# Altium footprint library pi4.PcbLib: 46 footprints (part 3 of 3)
Each footprint in its own frame and in the unit in brackets; x right, y up, seen from the top. Pads: shape width x height; smd on the part's side, far side on the other; paste and mask are expansions set on the pad; w line width, h text height; cw(c..) or ccw(c..) is an arc to the next point about the centre after c.
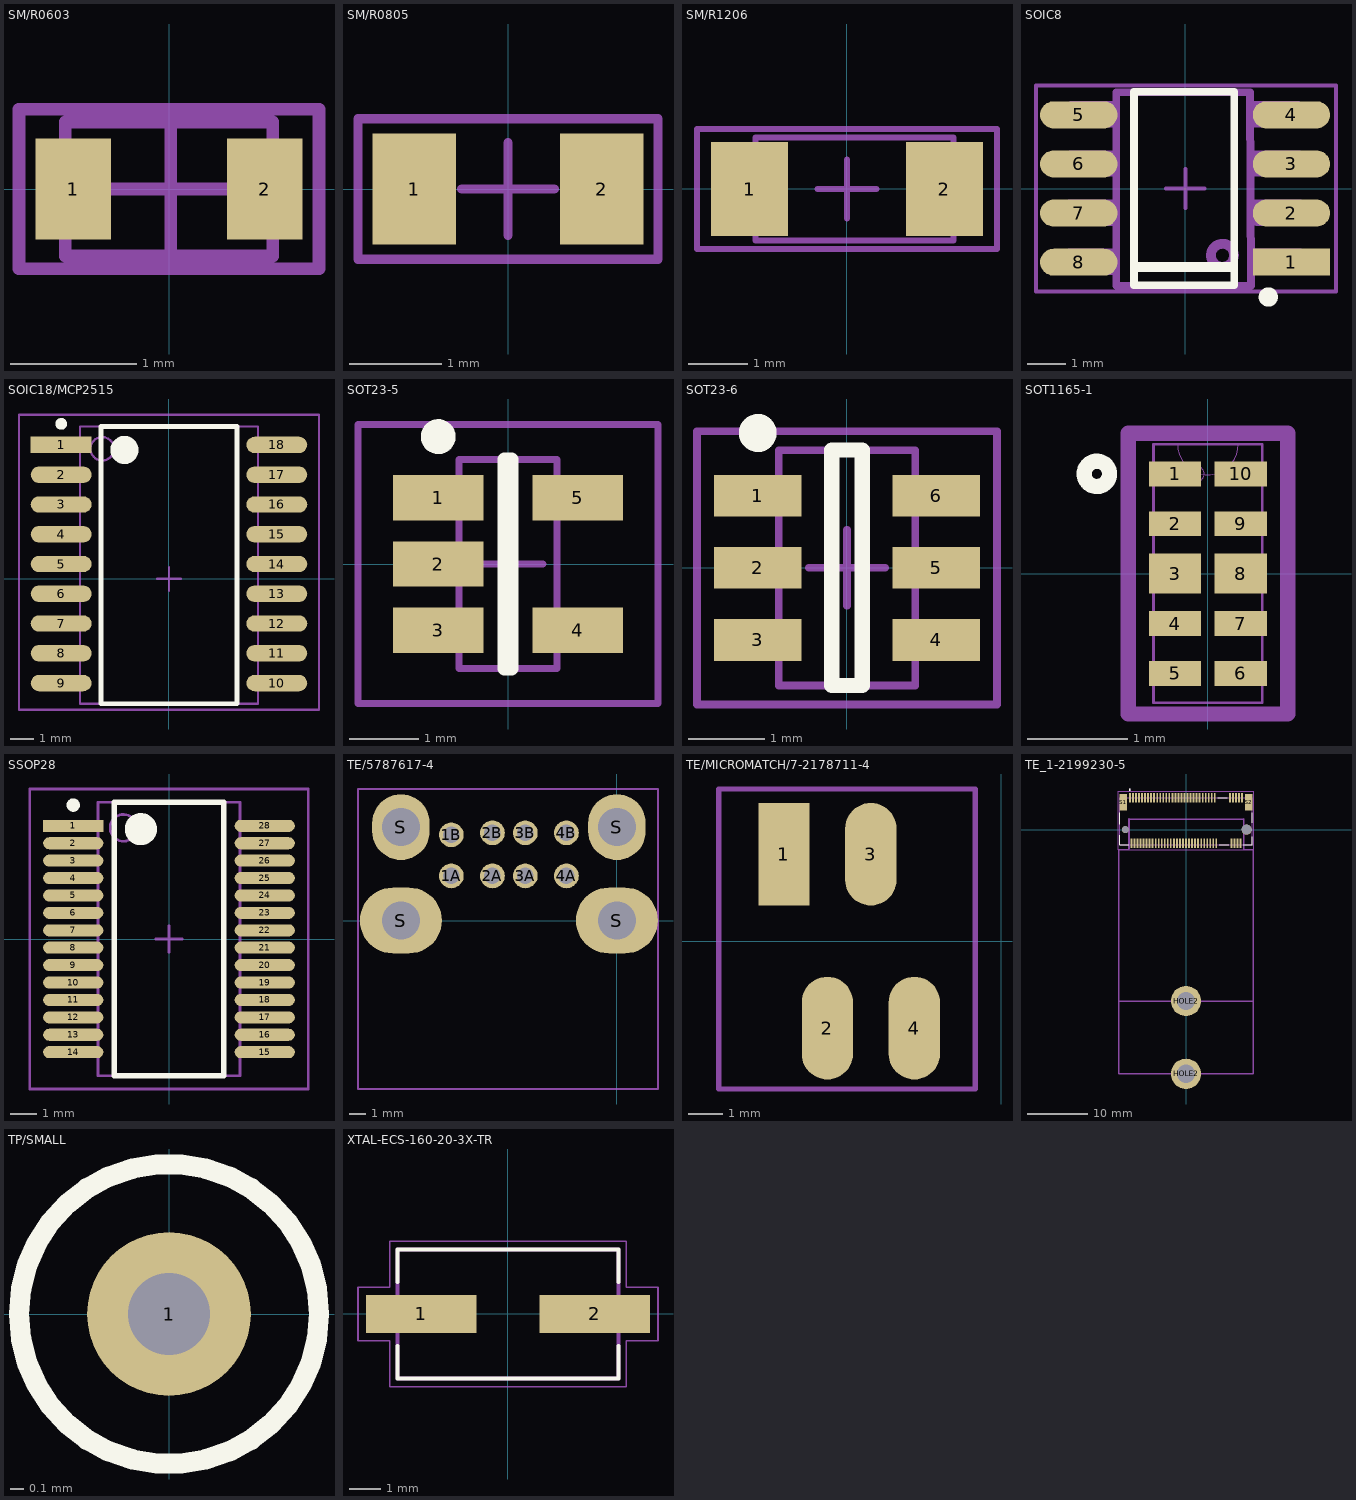
[diagram p2: the footprints below, top view; thin cyan lines are the x and y axes]

## SM/R0603 [mm] "Chip Resistor, Body 1.6x0.8mm, IPC Low Density"
height 0.6
pads (2):
  rect 0.6x0.8 smd: 1(-0.762,0) 2(0.762,0)
Mechanical 13:
  lines w0.1: -0.826,-0.533 -0.826,0.533 0.826,0.533 0.826,-0.533 -0.826,-0.533
Mechanical 15:
  lines w0.1: -0.462,0 0.488,0 ; 0.013,-0.475 0.013,0.475 ; -1.194,-0.635 -1.194,0.635 1.194,0.635 1.194,-0.635 -1.194,-0.635
3D body "RES0603-1.STEP": height 0.4, standoff 0, extent -0.8,-0.4 0.8,0.4

## SM/R0805 [mm] "Chip Resistor, Body 2.0x1.3mm, IPC Low Density"
height 0.65
pads (2):
  rect 0.9x1.2 smd: 1(-1.016,0) 2(1.016,0)
Mechanical 15:
  lines w0.1: -0.5,0 0.5,0 ; 0,-0.5 0,0.5 ; -1.626,-0.762 1.626,-0.762 1.626,0.762 -1.626,0.762 -1.626,-0.762
3D body "RES_0805L.STEP": height 0.21, standoff -0.2, extent -1,-0.625 1,0.625

## SM/R1206 [mm] "Chip Resistor, Body 3.2x1.6mm, IPC Low Density"
height 0.71
pads (2):
  rect 1.3x1.6 smd: 1(-1.651,0) 2(1.651,0)
Mechanical 13:
  lines w0.1: -1.548,-0.875 -1.548,0.875 1.802,0.875 1.802,-0.875 -1.548,-0.875
Mechanical 15:
  lines w0.1: -0.5,0 0.5,0 ; 0,-0.5 0,0.5 ; -2.54,-1.016 -2.54,1.016 2.54,1.016 2.54,-1.016 -2.54,-1.016
3D body "R1206.STEP": height 0.55, standoff 0, extent -1.6,-0.8 1.6,0.8

## SOIC8 [mm] "8-Pin Small Outline Integrated Circuit 1.27 mm Pitch, IPC Low Density"
height 1.75
pads (8):
  rect 2x0.7 smd: 1(2.749,-1.905)
  oval 2x0.7 smd: 2(2.749,-0.635) 3(2.749,0.635) 4(2.749,1.905) 5(-2.749,1.905) 6(-2.749,0.635) 7(-2.749,-0.635) 8(-2.749,-1.905)
Top Overlay:
  circle w0.25: c2.151,-2.805 r0.125
  lines w0.2: -1.321,-2.5 -1.321,2.5 1.27,2.5 1.27,-2.5 -1.321,-2.5
  lines w0.254: -1.27,-2.032 1.219,-2.032
Mechanical 13:
  circle w0.254: c0.965,-1.727 r0.297
  lines w0.2: -2.565,-2.083 -2.565,-1.651 ; -2.565,-0.813 -2.565,-0.381 ; -2.54,0.457 -2.54,0.889 ; -2.515,1.727 -2.515,2.159 ; -1.88,-2.134 -2.997,-2.134 -2.997,-1.651 -1.829,-1.651 ; -1.88,-0.864 -2.997,-0.864 -2.997,-0.381 -1.829,-0.381 ; -1.854,0.406 -2.972,0.406 -2.972,0.889 -1.803,0.889 ; -1.829,1.676 -2.946,1.676 -2.946,2.159 -1.778,2.159 ; -1.778,2.489 -1.778,-2.515 1.702,-2.515 1.676,2.489 -1.753,2.489 ; 1.753,2.159 2.921,2.159 2.921,1.676 1.803,1.676 ; 1.778,0.889 2.946,0.889 2.946,0.406 1.829,0.406 ; 1.803,-1.651 2.972,-1.651 2.972,-2.134 1.854,-2.134 ; 1.803,-0.381 2.972,-0.381 2.972,-0.864 1.854,-0.864 ; 2.489,1.727 2.489,2.159 ; 2.515,0.457 2.515,0.889 ; 2.54,-2.083 2.54,-1.651 ; 2.54,-0.813 2.54,-0.381
Mechanical 15:
  lines w0.1: -0.494,0 0.506,0 ; 0.006,-0.5 0.006,0.5 ; -3.855,-2.667 -3.855,2.667 3.901,2.667 3.901,-2.667 -3.855,-2.667
3D body "SOIC-8.STEP": height 1.75, standoff 0, extent -2.966,-2.5 3.046,2.5

## SOIC18/MCP2515 [mm] "SOIC, 18-Leads, Body 9.4 Pitch 1.27mm, IPC Low Density"
height 2.65
pads (18):
  rect 2.6x0.7 smd: 1(-4.6,5.715)
  oval 2.6x0.7 smd: 2(-4.6,4.445) 3(-4.6,3.175) 4(-4.6,1.905) 5(-4.6,0.635) 6(-4.6,-0.635) 7(-4.6,-1.905) 8(-4.6,-3.175) 9(-4.6,-4.445) 10(4.6,-4.445) 11(4.6,-3.175) 12(4.6,-1.905) 13(4.6,-0.635) 14(4.6,0.635) 15(4.6,1.905) 16(4.6,3.175) 17(4.6,4.445) 18(4.6,5.715)
Top Overlay:
  circle w0.6: c-1.9,5.5 r0.3
  circle w0.25: c-4.6,6.615 r0.125
  lines w0.2: -2.9,-5.334 2.9,-5.334 2.9,6.5 -2.9,6.5 -2.9,-5.334
Mechanical 13:
  circle w0.1: c-2.85,5.55 r0.5
  lines w0.1: -3.8,-5.334 3.8,-5.334 3.8,6.5 -3.8,6.5 -3.8,-5.334
Mechanical 15:
  lines w0.1: -0.5,0 0.5,0 ; 0,-0.5 0,0.5 ; -6.4,-5.588 6.4,-5.588 6.4,7 -6.4,7 -6.4,-5.588
3D body "User Library-MCP2515 SOIC-18.STEP": height 2.48, standoff -0.01, extent -5.219,-5.115 5.321,6.385

## SOT23-5 [mm] "SOT23, 5-Leads, Body 3.0x2.6mm (max), Pitch 0.95mm, IPC Low Density"
height 1.1
pads (5):
  rect 1.3x0.65 smd: 1(-1,0.95) 2(-1,0) 3(-1,-0.95) 4(1,-0.95) 5(1,0.95)
Top Overlay:
  circle w0.25: c-1,1.825 r0.125
  lines w0.2: -0.05,-1.5 -0.05,1.5 0.05,1.5 0.05,-1.5 -0.05,-1.5
Mechanical 13:
  lines w0.1: -0.7,-1.5 0.7,-1.5 0.7,1.5 -0.7,1.5 -0.7,-1.5
Mechanical 15:
  lines w0.1: -0.5,0 0.5,0 ; 0,-0.5 0,0.5 ; -2.15,-2 -2.15,2 2.15,2 2.15,-2 -2.15,-2
3D body "SOT-23-5.STEP": height 1.45, standoff -0.01, extent -1.524,-1.5 1.476,1.5

## SOT23-6 [mm] "SOT23, 6-Leads, Body 3.1x3.2mm (max), Pitch 0.95mm, IPC Medium Density"
height 1.45
pads (6):
  rect 1.15x0.55 smd: 1(-1.175,0.95) 2(-1.175,0) 3(-1.175,-0.95) 4(1.175,-0.95) 5(1.175,0) 6(1.175,0.95)
Top Overlay:
  circle w0.25: c-1.175,1.775 r0.125
  lines w0.2: -0.2,-1.55 0.2,-1.55 0.2,1.55 -0.2,1.55 -0.2,-1.55
Mechanical 13:
  lines w0.1: -0.9,-1.55 -0.9,1.55 0.9,1.55 0.9,-1.55 -0.9,-1.55
Mechanical 15:
  lines w0.1: -0.5,0 0.5,0 ; 0,-0.5 0,0.5 ; -1.975,-1.8 -1.975,1.8 1.975,1.8 1.975,-1.8 -1.975,-1.8
3D body "SOT23-6.STEP": height 1.3, standoff 0, extent -1.499,-1.5 1.501,1.5

## SOT1165-1 [mm]
pads (10):
  rect 0.525x0.25 smd paste-0.152 mask+0: 1(-0.33,1) 2(-0.33,0.5) 4(-0.33,-0.5) 5(-0.33,-1) 6(0.33,-1) 7(0.33,-0.5) 9(0.33,0.5) 10(0.33,1)
  rect 0.525x0.4 smd paste+0 mask+0: 3(-0.33,0) 8(0.33,0)
Top Overlay:
  circle w0.152: c-1.114,1 r0.127
Mechanical 13:
  circle w0: c-0.114,1 r0.076
  lines w0: -0.305,1.295 ccw(c0,1.295) 0.305,1.295
  lines w0.025: -0.546,-1.295 0.546,-1.295 0.546,1.295 -0.546,1.295 -0.546,-1.295
Mechanical 15:
  lines w0.152: -0.8,-1.407 -0.8,1.407 0.8,1.407 0.8,-1.407 -0.8,-1.407
3D body "SOT1165-1.STEP": height 0.45, standoff -0.02, extent -0.501,-1.25 0.499,1.25

## SSOP28 [mm]
height 2
pads (28):
  rect 2.25x0.45 smd: 1(-3.575,4.225)
  oval 2.25x0.45 smd: 2(-3.575,3.575) 3(-3.575,2.925) 4(-3.575,2.275) 5(-3.575,1.625) 6(-3.575,0.975) 7(-3.575,0.325) 8(-3.575,-0.325) 9(-3.575,-0.975) 10(-3.575,-1.625) 11(-3.575,-2.275) 12(-3.575,-2.925) 13(-3.575,-3.575) 14(-3.575,-4.225) 15(3.575,-4.225) 16(3.575,-3.575) 17(3.575,-2.925) 18(3.575,-2.275) 19(3.575,-1.625) 20(3.575,-0.975) 21(3.575,-0.325) 22(3.575,0.325) 23(3.575,0.975) 24(3.575,1.625) 25(3.575,2.275) 26(3.575,2.925) 27(3.575,3.575) 28(3.575,4.225)
Top Overlay:
  circle w0.25: c-3.575,5 r0.125
  circle w0.6: c-1.05,4.1 r0.3
  lines w0.2: -2.05,-5.1 -2.05,5.1 2.05,5.1 2.05,-5.1 -2.05,-5.1
Mechanical 13:
  circle w0.1: c-1.7,4.15 r0.5
  lines w0.1: -2.65,-5.1 -2.65,5.1 2.65,5.1 2.65,-5.1 -2.65,-5.1
Mechanical 15:
  lines w0.1: -0.5,0 0.5,0 ; 0,-0.5 0,0.5 ; -5.2,-5.6 -5.2,5.6 5.2,5.6 5.2,-5.6 -5.2,-5.6
3D body "User Library-SSOP-28.STEP": height 1.92, standoff -0.03, extent -4.087,-5.242 4.138,5.258

## TE/5787617-4 [mm] "USB DUAL"
pads (12):
  round 1.5 hole 1: 1A(-10.07,2.71) 1B(-10.07,5.21) 2A(-7.57,2.71) 2B(-7.57,5.33) 3A(-5.57,2.71) 3B(-5.57,5.33) 4A(-3.07,2.71) 4B(-3.07,5.33)
  oval 5x4 hole 2.3: S(-13.14,0) S(0,0)
  oval 3.5x4 hole 2.3: S(-13.14,5.68) S(0,5.68)
Mechanical 15:
  lines w0.15: -15.75,-10.25 -15.75,8 2.5,8 2.5,-10.25 -15.75,-10.25
3D body "c-5787617-4-c-3d.STEP": height 16.17, standoff -3.97, extent -14.707,-10.292 1.533,6.888

## TE/MICROMATCH/7-2178711-4 [mm]
pads (4):
  rect 1.5x3 smd: 1(-6.35,2.54)
  oval 1.5x3 smd: 2(-5.08,-2.54) 3(-3.81,2.54) 4(-2.54,-2.54)
Mechanical 15:
  lines w0.15: -8.255,-4.318 -0.762,-4.318 -0.762,4.445 -8.255,4.445 -8.255,-4.318
3D body "mm2.STEP": height 5.25, standoff 0, extent -7.889,-3.5 -0.889,3.5

## TE_1-2199230-5 [mm]
pads (73):
  rect 0.3x1.55 smd: 1(-9.25,5.275) 2(-9,-2.275) 3(-8.75,5.275) 4(-8.5,-2.275) 5(-8.25,5.275) 6(-8,-2.275) 7(-7.75,5.275) 8(-7.5,-2.275) 9(-7.25,5.275) 10(-7,-2.275) 11(-6.75,5.275) 12(-6.5,-2.275) 13(-6.25,5.275) 14(-6,-2.275) 15(-5.75,5.275) 16(-5.5,-2.275) 17(-5.25,5.275) 18(-5,-2.275) 19(-4.75,5.275) 20(-4.5,-2.275) 21(-4.25,5.275) 22(-4,-2.275) 23(-3.75,5.275) 24(-3.5,-2.275) 25(-3.25,5.275) 26(-3,-2.275) 27(-2.75,5.275) 28(-2.5,-2.275) 29(-2.25,5.275) 30(-2,-2.275) 31(-1.75,5.275) 32(-1.5,-2.275) 33(-1.25,5.275) 34(-1,-2.275) 35(-0.75,5.275) 36(-0.5,-2.275) 37(-0.25,5.275) 38(0,-2.275) 39(0.25,5.275) 40(0.5,-2.275) 41(0.75,5.275) 42(1,-2.275) 43(1.25,5.275) 44(1.5,-2.275) 45(1.75,5.275) 46(2,-2.275) 47(2.25,5.275) 48(2.5,-2.275) 49(2.75,5.275) 50(3,-2.275) 51(3.25,5.275) 52(3.5,-2.275) 53(3.75,5.275) 54(4,-2.275) 55(4.25,5.275) 56(4.5,-2.275) 57(4.75,5.275) 58(5,-2.275) 67(7.25,5.275) 68(7.5,-2.275) 69(7.75,5.275) 70(8,-2.275) 71(8.25,5.275) 72(8.5,-2.275) 73(8.75,5.275) 74(9,-2.275) 75(9.25,5.275)
  round 5 hole 3: HOLE2(0,-40.25) HOLE2(0,-28.25)
  rect 1.2x2.75 smd: S1(-10.35,4.5) S2(10.35,4.5)
  round 1.15 hole 1.15 unplated: ""(-10,0)
  round 1.65 hole 1.65 unplated: ""(10,0)
Top Overlay:
  circle w0.2: c-9.25,6.6 r0.1
  lines w0.127: -10.95,-0.895 -10.95,-2.5 -9.47,-2.5 ; -10.95,0.895 -10.95,2.805 ; 5.22,5.25 6.78,5.25 ; 5.47,-2.5 7.03,-2.5 ; 9.47,-2.5 10.95,-2.5 10.95,-1.145 ; 10.95,1.145 10.95,2.8
Mechanical 13:
  circle w0.2: c-9.25,6.6 r0.1
  lines w0.127: -10.95,-2.5 -10.95,5.25 10.95,5.25 10.95,-2.5 -10.95,-2.5
Mechanical 15:
  lines w0.05: -11.2,-3.3 11.2,-3.3 11.2,6.3 -11.2,6.3 -11.2,-3.3
  lines w0.254: -11.049,-28.321 11.049,-28.321 ; -9.398,1.75 9.525,1.75 ; -9.398,1.778 -9.398,-3.175 -9.525,-3.302 -11.049,-3.302 -11.049,-40.259 11.049,-40.259 11.049,-3.302 9.525,-3.302 9.525,1.778
3D body "1-2199230-5.STEP": height 4.09, standoff -0.62, extent -10.95,-2.833 10.95,5.867
3D body "9774015243.stp": height 1.5, standoff -1.4, extent -2.175,-30.353 2.175,-26.009
3D body "9774015243.stp": height 1.5, standoff -1.4, extent -2.175,-42.418 2.175,-38.074

## TP/SMALL [mm]
pads (1):
  round 1.2 hole 0.6: 1(0,0)
Top Overlay:
  circle w0.15: c0,0 r1.1

## XTAL-ECS-160-20-3X-TR [mm] "CRYSTAL"
pads (2):
  rect 3.5x1.2 smd: 1(-2.75,0) 2(2.75,0)
Top Overlay:
  lines w0.127: -3.5,-1.01 -3.5,-2.05 3.5,-2.05 3.5,-1.01 ; -3.5,1.01 -3.5,2.05 3.5,2.05 3.5,1.01
Mechanical 13:
  lines w0.127: -3.5,-2.05 3.5,-2.05 3.5,2.05 -3.5,2.05 -3.5,-2.05
Mechanical 15:
  lines w0.05: -4.75,-0.85 -3.75,-0.85 -3.75,-2.3 3.75,-2.3 3.75,-0.85 4.75,-0.85 4.75,0.85 3.75,0.85 3.75,2.3 -3.75,2.3 -3.75,0.85 -4.75,0.85 -4.75,-0.85
3D body "ECS-160-20-3X-TR.STEP": height 2.3, standoff 0, extent -3.8,-2.05 3.8,2.05